# Altium footprint library Vobla.PcbLib: 147 footprints (part 4 of 10)
Each footprint in its own frame and in the unit in brackets; x right, y up, seen from the top. Pads: shape width x height; smd on the part's side, far side on the other; paste and mask are expansions set on the pad; w line width, h text height; cw(c..) or ccw(c..) is an arc to the next point about the centre after c.
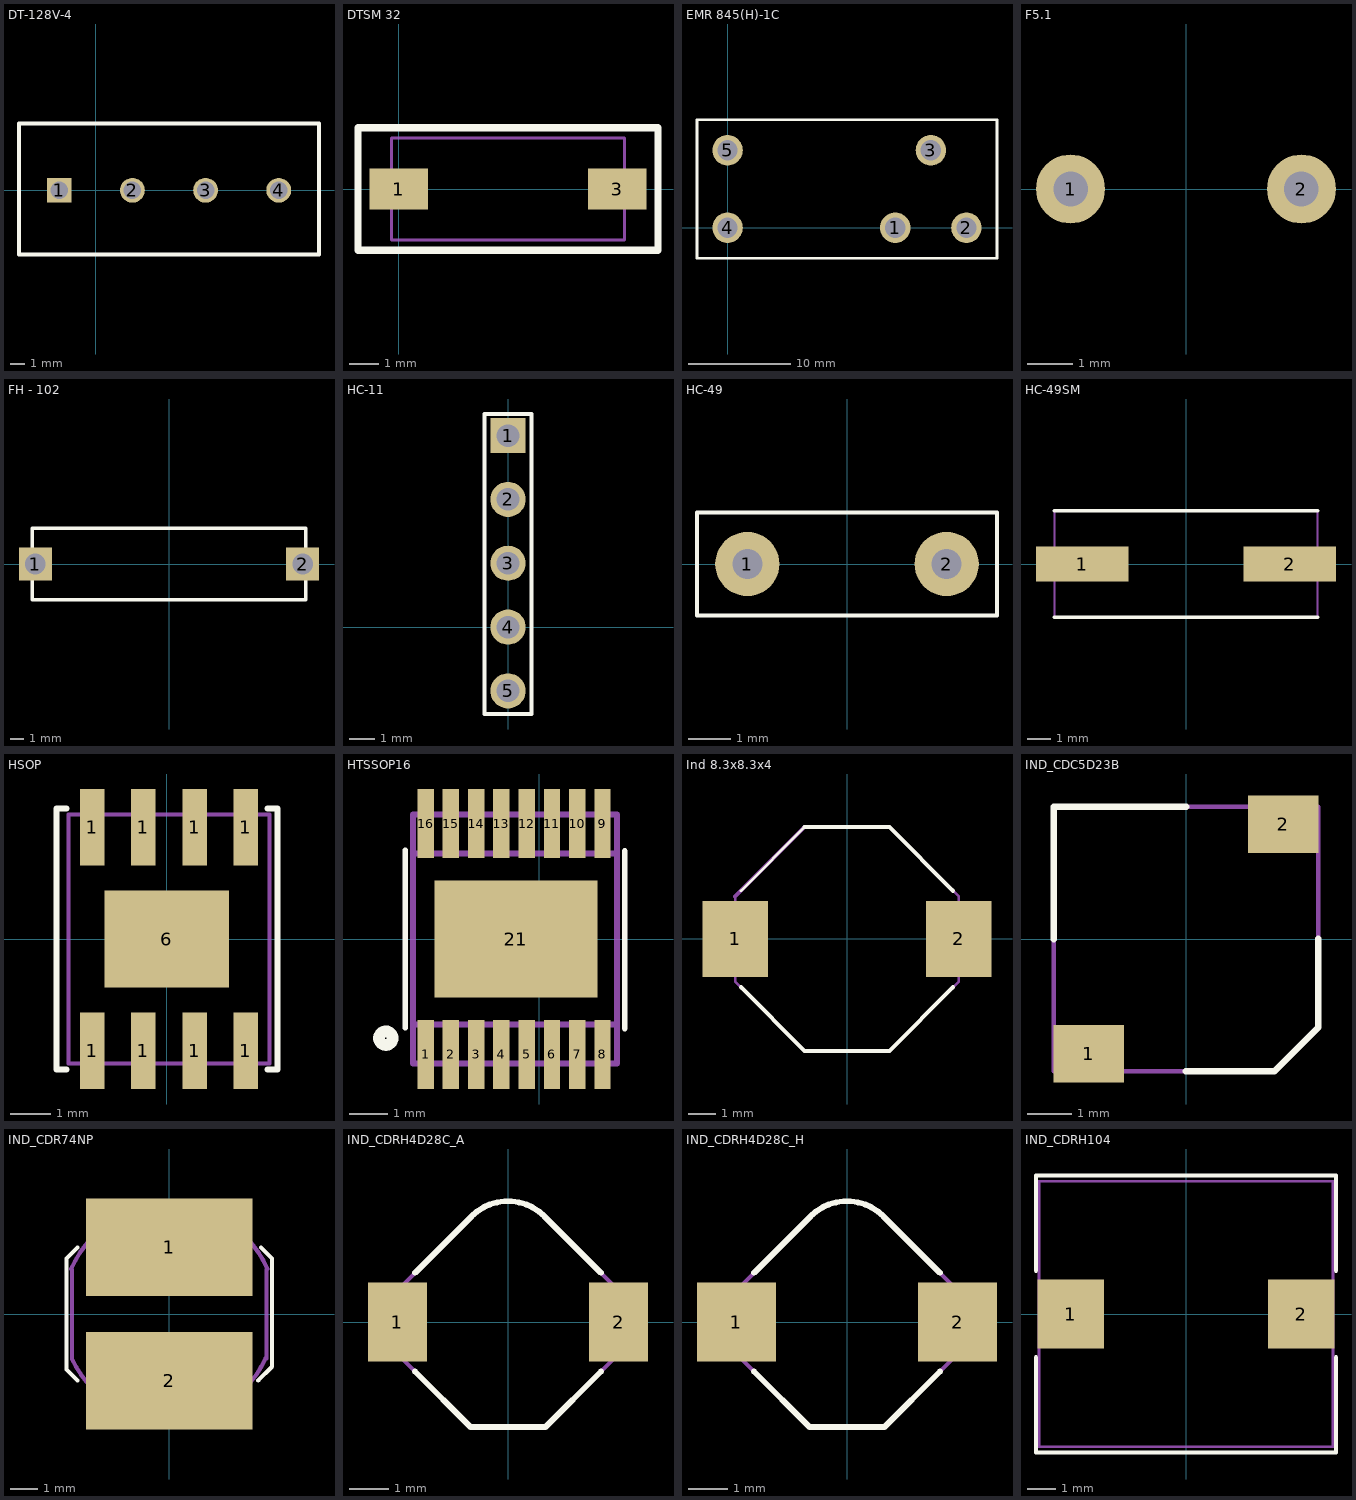
[diagram p3: the footprints below, top view; thin cyan lines are the x and y axes]

## DT-128V-4 [mm]
pads (4):
  rect 1.7x1.7 hole 1.2: 1(-2.5,0)
  round 1.7 hole 1.2: 2(2.5,0) 3(7.5,0) 4(12.5,0)
Top Overlay:
  lines w0.254: -5.25,-4.394 -5.25,4.572 15.25,4.572 15.25,-4.394 -5.25,-4.394
3D body "DT128V_4.STEP": height 15.2, standoff -3.5, extent -5.25,-4.394 15.25,4.606

## DTSM 32 [mm] "Кнопка"
pads (2):
  rect 2x1.4 smd: 1(0,0) 3(7.5,0)
Top Overlay:
  lines w0.25: -1.4,2.1 8.9,2.1
  lines w0.254: -1.4,2.1 -1.4,-2.1 8.9,-2.1 8.9,2.1
Mechanical 7:
  lines w0.1: -0.25,-1.75 -0.25,1.75 7.75,1.75 7.75,-1.75 -0.25,-1.75
3D body "User Library-dtsm-32n.step": height 5.5, standoff 0, extent -0.25,-1.75 7.75,1.75

## EMR 845(H)-1C [mm]
pads (5):
  round 3 hole 2: 1(16.5,0) 2(23.5,0) 3(20,7.6) 4(0,0) 5(0,7.6)
Top Overlay:
  lines w0.254: -3,-3 -3,10.5 -3,10.6 26.5,10.6 26.5,10.5 26.5,7.5 26.5,-3 -3,-3
3D body "845(H)-1C.STEP": height 19, standoff -3, extent -2.587,-2.311 26.413,10.389

## F5.1 [mil]
pads (2):
  round 60 hole 30: 1(-100.39,0) 2(100.39,0)
3D body "MF-R110.STEP": height 608.27, standoff -251.97, extent -185.31,-117.76 185.51,116.27

## FH - 102 [mm]
pads (2):
  rect 2.4x2.4 hole 1.5: 1(-9.75,0) 2(9.75,0)
Top Overlay:
  lines w0.254: -10,-2.6 10,-2.6 10,2.6 -10,2.6 -10,-2.6

## HC-11 [mm] "Bluetooth модуль"
height 0.05
pads (5):
  rect 1.4x1.4 hole 0.9: 1(0,7.62)
  round 1.4 hole 0.9: 2(0,5.08) 3(0,2.54)
  round 1.4 hole 0.9 mask+0.102: 4(0,0) 5(0,-2.54)
Top Overlay:
  lines w0.15: -0.93,-3.46 -0.93,8.48 0.93,8.48 0.93,-3.46 -0.93,-3.46
Mechanical 7:
  lines w0.1: -0.93,-3.46 -0.93,8.48 0.93,8.48 0.93,-3.46 -0.93,-3.46
Mechanical 10:
  text ".Comment" at 1.1,-0.3 h0.6
  text ".Designator" at 1.2,8.4 h0.8
3D body "HC-11.STEP": height 8.57, standoff -0.05, extent -8.095,-4.55 25.445,9.45

## HC-49 [mm] "Кварцевый резонатор"
pads (2):
  round 1.5 hole 0.7: 1(-2.325,0) 2(2.325,0)
Top Overlay:
  lines w0.1: -3.5,-1.2 -1.3,-1.2 3.5,-1.2 3.5,1.2 -3.5,1.2 -3.5,-1.2
3D body "User Library-HC49_Crystal.step": height 3.6, standoff -12.7, extent -5.675,-2.325 5.675,2.325

## HC-49SM [mm] "Кварцевый резонатор поверхностного монтажа"
pads (2):
  rect 4x1.5 smd: 1(-4.5,0) 2(4.5,0)
Top Overlay:
  lines w0.15: -5.7,-2.3 5.7,-2.3 ; -5.7,2.3 5.7,2.3
Mechanical 7:
  lines w0.1: -5.7,-2.3 5.7,-2.3 5.7,2.3 -5.7,2.3 -5.7,-2.3
3D body "User Library-HC49_Crystal_SM.step": height 4.5, standoff -0.01, extent -6.95,-2.5 6.95,2.5

## HSOP [mm]
pads (9):
  rect 0.61x1.91 smd: 1(-1.855,-2.78) 1(-1.855,2.78) 1(-0.585,-2.78) 1(-0.585,2.78) 1(0.685,-2.78) 1(0.685,2.78) 1(1.955,-2.78) 1(1.955,2.78)
  rect 3.1x2.41 smd: 6(0,0)
Top Overlay:
  lines w0.15: -2.5,-3.25 -2.75,-3.25 -2.75,3.25 -2.5,3.25 ; 2.5,-3.25 2.75,-3.25 2.75,3.25 2.5,3.25
Mechanical 7:
  lines w0.1: -2.45,-3.1 2.55,-3.1 2.55,3.1 -2.45,3.1 -2.45,-3.1
3D body "User Library-HSOP8.STEP": height 1.75, standoff 0, extent -2.45,-3.1 2.55,3.1

## HTSSOP16 [mm]
height 1.1
pads (17):
  rect 0.42x1.78 smd mask+0.075: 1(-2.925,-2.97) 2(-2.275,-2.97) 3(-1.625,-2.97) 4(-0.975,-2.97) 5(-0.325,-2.97) 6(0.325,-2.97) 7(0.975,-2.97) 8(1.625,-2.97) 9(1.625,2.97) 10(0.975,2.97) 11(0.325,2.97) 12(-0.325,2.97) 13(-0.975,2.97) 14(-1.625,2.97) 15(-2.275,2.97) 16(-2.925,2.97)
  rect 4.2x3 smd mask+0.075: 21(-0.6,0)
Top Overlay:
  circle w0.3: c-3.95,-2.552 r0.175
  lines w0.152: -3.45,-2.284 -3.45,2.284 ; 2.2,-2.3 2.2,2.269
Mechanical 7:
  lines w0.152: -3.25,-2.2 2,-2.2 ; -3.25,2.2 2,2.2 ; -3.25,-3.2 2,-3.2 2,3.2 -3.25,3.2 -3.25,-3.2
Mechanical 10:
  text ".Designator" at -1.85,-5.225 h1.52
  text ".Comment" at -1.7,4.45 h1.52
3D body: height 0.5, standoff 0.05, extent -3.25,-3.2 2,-2.2
3D body: height 0.5, standoff 0.05, extent -3.25,2.2 2,3.2
3D body: height 1.1, standoff 0.05, extent -3.25,-2.2 2,2.2

## Ind 8.3x8.3x4 [mm]
pads (2):
  rect 2.4x2.8 smd: 1(-4.1,0) 2(4.1,0)
Top Overlay:
  lines w0.1: -3.889,1.768 -1.556,4.101
  lines w0.15: -3.889,-1.768 -1.556,-4.101 1.556,-4.101 3.889,-1.768 ; -1.556,4.101 1.556,4.101 3.889,1.768
Mechanical 7:
  lines w0.1: -4.101,1.556 -4.101,-1.556 -1.556,-4.101 1.556,-4.101 4.101,-1.556 4.101,1.556 1.556,4.101 -1.556,4.101
  lines w0.15: -4.101,1.556 -1.556,4.101
Mechanical 10:
  text ".Designator" at -1.5,5.2 h0.8
  text ".Comment" at -1.2,-5.3 h0.6
3D body: height 4, standoff 0.15, extent -4.101,-4.101 4.101,4.101

## IND_CDC5D23B [mm]
pads (2):
  rect 1.6x1.3 smd: 1(-2.2,-2.6) 2(2.2,2.6)
Top Overlay:
  lines w0.15: -3,0 -3,3 0,3 ; 0,-3 2,-3 3,-2 3,0
Mechanical 7:
  lines w0.1: -3,-3 2,-3 3,-2 3,3 -3,3 -3,-2.5 -3,-3
Mechanical 10:
  text ".Designator" at -0.985,0.276 h0.8
  text ".Comment" at -0.985,-0.414 h0.6
3D body: height 2.5, standoff 0, extent -3,-3 3,3

## IND_CDR74NP [mm]
pads (2):
  rect 6x3.5 smd: 1(0,2.4) 2(0,-2.4)
Top Overlay:
  lines w0.15: -3.3,-2.4 -3.7,-2 -3.7,-1.9 -3.7,1.9 -3.7,2 -3.3,2.4 ; 3.3,2.4 3.7,2 3.7,1.9 3.7,-1.9 3.2,-2.4 ; 3.2,-2.4 3.2,-2.4
Mechanical 7:
  lines w0.15: -3.534,1.615 cw(c0,0.087) 3.534,1.615 ; -3.509,-1.611 ccw(c-0.022,0.022) 3.475,-1.588 ; -3.5,-1.6 -3.5,1.6 ; 3.5,-1.6 3.5,1.6
3D body: height 4.5, standoff 0, extent -3.819,-3.842 3.85,3.843

## IND_CDRH4D28C_A [mm]
height 3
pads (2):
  rect 1.5x2 smd: 1(-2.8,0) 2(2.8,0)
Top Overlay:
  lines w0.15: -2.356,-1.25 -0.955,-2.652 0.955,-2.652 2.356,-1.25 ; -2.353,1.253 -0.919,2.687 cw(c0,1.768) 0.919,2.687 2.353,1.253
Mechanical 7:
  lines w0.1: -2.899,-0.707 -2.899,0.707 -0.919,2.687 cw(c0,1.768) 0.919,2.687 2.899,0.707 2.899,-0.707 0.955,-2.652 -0.955,-2.652 -2.899,-0.707
Mechanical 10:
  text ".Designator" at -0.985,0.265 h0.8
  text ".Comment" at -0.985,-0.425 h0.6
3D body: height 3, standoff 0, extent -2.899,-2.652 2.899,2.687
3D body: height 3, standoff 0, extent -1.29,0.47 1.3,3.065

## IND_CDRH4D28C_H [mm]
height 3
pads (2):
  rect 2x2 smd: 1(-2.8,0) 2(2.8,0)
Top Overlay:
  lines w0.15: -2.356,-1.25 -0.955,-2.652 0.955,-2.652 2.356,-1.25 ; -2.353,1.253 -0.919,2.687 cw(c0,1.768) 0.919,2.687 2.353,1.253
Mechanical 7:
  lines w0.1: -2.899,-0.707 -0.955,-2.652 0.955,-2.652 2.899,-0.707 2.899,0.707 0.919,2.687 ccw(c0,1.768) -0.919,2.687 -2.899,0.707 -2.899,-0.707
Mechanical 10:
  text ".Comment" at -0.985,-0.425 h0.6
  text ".Designator" at -0.985,0.265 h0.8
3D body: height 3, standoff 0, extent -1.29,0.47 1.3,3.065
3D body: height 3, standoff 0, extent -2.899,-2.652 2.899,2.687

## IND_CDRH104 [mm]
pads (2):
  rect 2.3x2.4 smd: 1(-4,0) 2(4,0)
Top Overlay:
  lines w0.15: -5.2,-1.5 -5.2,-4.8 5.2,-4.8 5.2,-1.5 ; -5.2,1.5 -5.2,4.8 5.2,4.8 5.2,1.5
Mechanical 7:
  lines w0.1: -5.1,-4.6 5.1,-4.6 5.1,4.6 -5.1,4.6 -5.1,-4.6
Mechanical 10:
  text ".Designator" at -1.5,5.5 h0.8
  text ".Comment" at -1.1,-6.1 h0.6
3D body: height 5, standoff 0.2, extent -5.1,-4.6 5.1,4.6